# Altium footprint library SPECIAL.PcbLib: 68 footprints (part 3 of 5)
Each footprint in its own frame and in the unit in brackets; x right, y up, seen from the top. Pads: shape width x height; smd on the part's side, far side on the other; paste and mask are expansions set on the pad; w line width, h text height; cw(c..) or ccw(c..) is an arc to the next point about the centre after c.
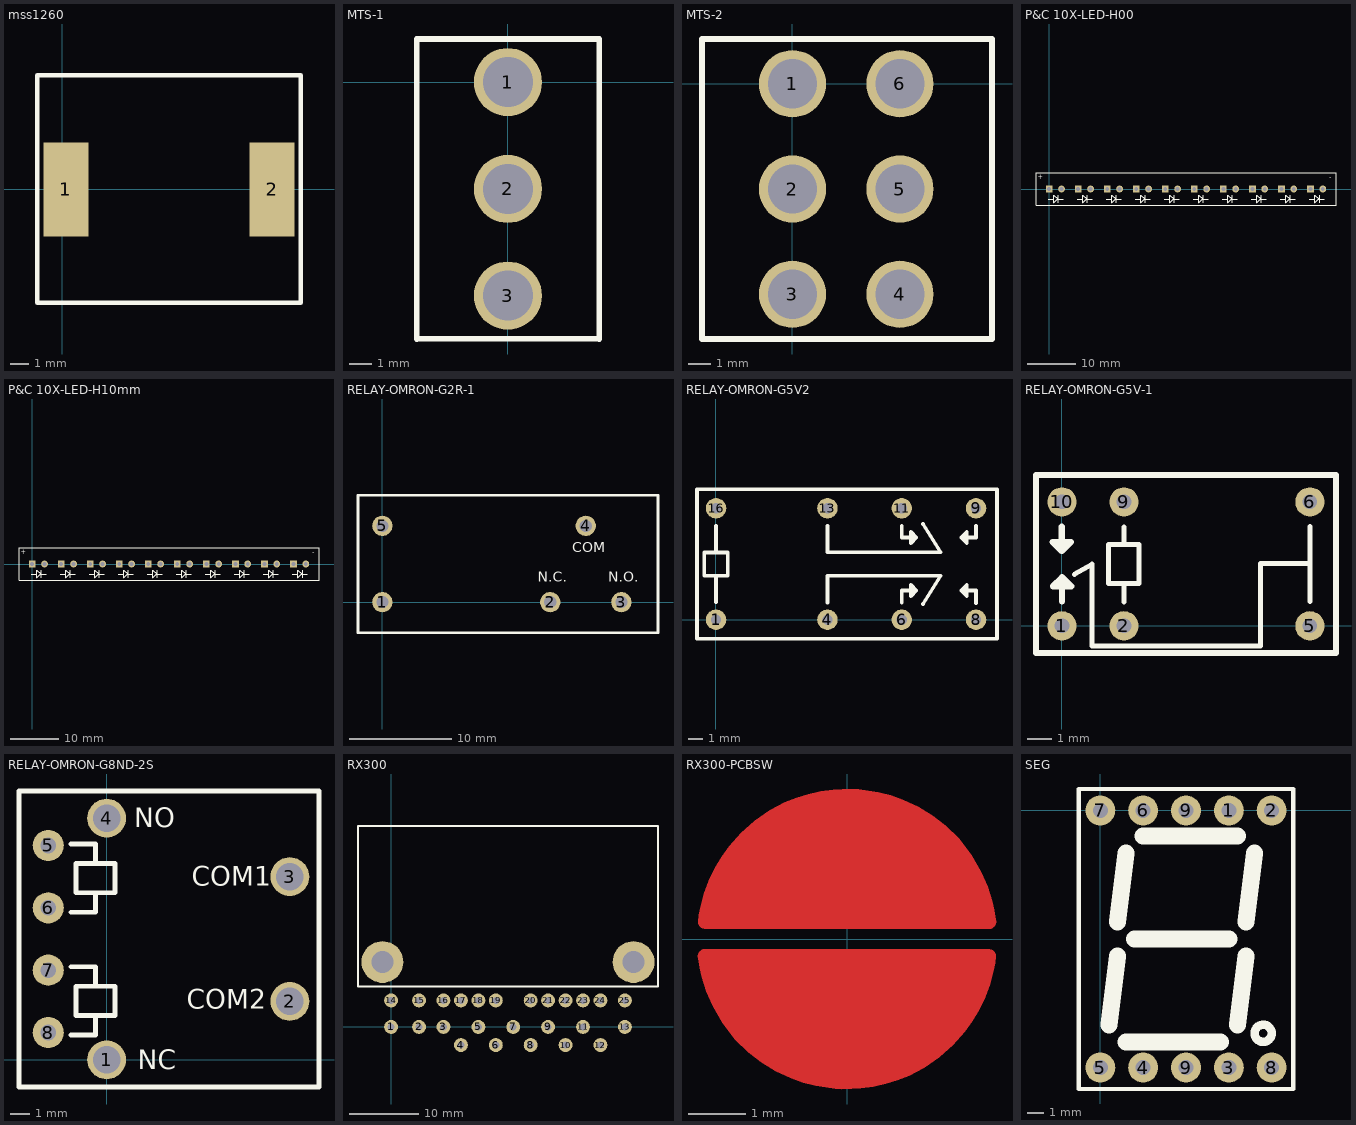
[diagram p2: the footprints below, top view; thin cyan lines are the x and y axes]

## mss1260 [mm]
pads (2):
  rect 2.4x5 smd: 1(0.2,-0.008) 2(11.2,-0.008)
Top Overlay:
  lines w0.25: -1.335,-6.044 -1.335,6.08 ; -1.334,-6.044 12.725,-6.044 ; -1.334,6.08 12.726,6.08 ; 12.73,-6.044 12.73,6.08
3D body "SW3dPS-MSS1260.STEP": height 6.2, standoff 0.06, extent -0.496,-6.12 11.803,6.18

## MTS-1 [mm]
pads (3):
  round 3 hole 2.2: 1(0,0) 2(0,-4.7) 3(0,-9.4)
Top Overlay:
  lines w0.254: -4.01,-11.31 -4.01,1.9 ; -4,-11.3 4,-11.3 ; -4,1.9 4,1.9 ; 4.02,-11.31 4.02,1.9
3D body "User Library-MTS-10x-A2.STEP": height 28.34, standoff -6.3, extent -3.86,-11.39 4.04,1.81

## MTS-2 [mm]
pads (6):
  round 3 hole 2.2: 1(0,0) 2(0,-4.7) 3(0,-9.4) 4(4.8,-9.4) 5(4.8,-4.7) 6(4.8,0)
Top Overlay:
  lines w0.254: -4.04,-11.4 8.91,-11.4 8.91,2 -4.04,2 -4.04,-11.4
3D body "User Library-MTS-20x-A2.STEP": height 28.84, standoff -5.8, extent -3.93,-11.31 8.77,1.89

## P&C 10X-LED-H00 [mm]
height 18
pads (20):
  rect 1.4x1.4 hole 0.8: 1(0,0) 1(5.95,0) 1(11.9,0) 1(17.85,0) 1(23.8,0) 1(29.75,0) 1(35.7,0) 1(41.65,0) 1(47.6,0) 1(53.55,0)
  round 1.4 hole 0.8: 2(2.54,0) 2(8.49,0) 2(14.44,0) 2(20.39,0) 2(26.34,0) 2(32.29,0) 2(38.24,0) 2(44.19,0) 2(50.14,0) 2(56.09,0)
Top Overlay:
  lines w0.2: -0.19,-2.06 0.93,-2.06 ; 1.72,-2.05 2.84,-2.05 ; 1.87,-2.82 1.87,-1.26 ; 5.76,-2.06 6.88,-2.06 ; 7.67,-2.05 8.79,-2.05 ; 7.82,-2.82 7.82,-1.26 ; 11.71,-2.06 12.83,-2.06 ; 13.62,-2.05 14.74,-2.05 ; 13.77,-2.82 13.77,-1.26 ; 17.66,-2.06 18.78,-2.06 ; 19.57,-2.05 20.69,-2.05 ; 19.72,-2.82 19.72,-1.26 ; 23.61,-2.06 24.73,-2.06 ; 25.52,-2.05 26.64,-2.05 ; 25.67,-2.82 25.67,-1.26 ; 29.56,-2.06 30.68,-2.06 ; 31.47,-2.05 32.59,-2.05 ; 31.62,-2.82 31.62,-1.26 ; 35.51,-2.06 36.63,-2.06 ; 37.42,-2.05 38.54,-2.05 ; 37.57,-2.82 37.57,-1.26 ; 41.46,-2.06 42.58,-2.06 ; 43.37,-2.05 44.49,-2.05 ; 43.52,-2.82 43.52,-1.26 ; 47.41,-2.06 48.53,-2.06 ; 49.32,-2.05 50.44,-2.05 ; 49.47,-2.82 49.47,-1.26 ; 53.36,-2.06 54.48,-2.06 ; 55.27,-2.05 56.39,-2.05 ; 55.42,-2.82 55.42,-1.26 ; 1.72,-2.04 0.94,-1.26 0.94,-2.82 1.72,-2.04 ; 1.72,-2.04 1.72,-2.04 ; 7.67,-2.04 6.89,-2.82 6.89,-1.26 7.67,-2.04 ; 7.67,-2.04 7.67,-2.04 ; 13.62,-2.04 12.84,-2.82 12.84,-1.26 13.62,-2.04 ; 13.62,-2.04 13.62,-2.04 ; 19.57,-2.04 18.79,-2.82 18.79,-1.26 19.57,-2.04 ; 19.57,-2.04 19.57,-2.04 ; 25.52,-2.04 24.74,-2.82 24.74,-1.26 25.52,-2.04 ; 25.52,-2.04 25.52,-2.04 ; 31.47,-2.04 30.69,-2.82 30.69,-1.26 31.47,-2.04 ; 31.47,-2.04 31.47,-2.04 ; 37.42,-2.04 36.64,-2.82 36.64,-1.26 37.42,-2.04 ; 37.42,-2.04 37.42,-2.04 ; 43.37,-2.04 42.59,-2.82 42.59,-1.26 43.37,-2.04 ; 43.37,-2.04 43.37,-2.04 ; 49.32,-2.04 48.54,-2.82 48.54,-1.26 49.32,-2.04 ; 49.32,-2.04 49.32,-2.04 ; 55.27,-2.04 54.49,-2.82 54.49,-1.26 55.27,-2.04 ; 55.27,-2.04 55.27,-2.04 ; -2.7,-3.3 58.8,-3.3 58.8,3.3 -2.7,3.3 -2.7,-3.3
  text "+" at -2.32,2 h1
  text "-" at 57.4,2 h1
3D body: height 8.5, standoff 7, extent 51.3,-1.45 57.25,1.45
3D body: height 7, standoff 0, extent 51.3,-3 58.35,3
3D body: height 8.5, standoff 7, extent 52.4,-1.45 58.35,1.45
3D body: height 7, standoff 0, extent 45.35,-3 51.3,3
3D body: height 8.5, standoff 7, extent 45.35,-1.45 51.3,1.45
3D body: height 7, standoff 0, extent 39.4,-3 45.35,3
3D body: height 8.5, standoff 7, extent 39.4,-1.45 45.35,1.45
3D body: height 7, standoff 0, extent 33.45,-3 39.4,3
3D body: height 8.5, standoff 7, extent 33.45,-1.45 39.4,1.45
3D body: height 7, standoff 0, extent 27.5,-3 33.45,3
3D body: height 8.5, standoff 7, extent 27.5,-1.45 33.45,1.45
3D body: height 7, standoff 0, extent 21.55,-3 27.5,3
3D body: height 8.5, standoff 7, extent 21.55,-1.45 27.5,1.45
3D body: height 7, standoff 0, extent 15.6,-3 21.55,3
3D body: height 8.5, standoff 7, extent 15.6,-1.45 21.55,1.45
3D body: height 7, standoff 0, extent 9.65,-3 15.6,3
3D body: height 8.5, standoff 7, extent 9.65,-1.45 15.6,1.45
3D body: height 7, standoff 0, extent 3.7,-3 9.65,3
3D body: height 8.5, standoff 7, extent 3.7,-1.45 9.65,1.45
3D body: height 8.5, standoff 7, extent -2.25,-1.45 3.7,1.45
3D body: height 7, standoff 0, extent -2.25,-3 3.7,3
3D body: height 3.8, standoff 0.3, extent 4.8,-1.45 9.65,1.45
3D body: height 8.4, standoff 3.8, extent 4.8,-0.55 9.65,0.55
3D body: height 15, standoff -3, extent 8.24,-0.25 8.74,0.25
3D body: height 17, standoff -3, extent 5.7,-0.25 6.2,0.25
3D body: height 17, standoff -3, extent -0.25,-0.25 0.25,0.25
3D body: height 15, standoff -3, extent 2.29,-0.25 2.79,0.25
3D body: height 8.4, standoff 3.8, extent -1.15,-0.55 3.7,0.55
3D body: height 3.8, standoff 0.3, extent -1.15,-1.45 3.7,1.45
3D body: height 15, standoff -3, extent 14.19,-0.25 14.69,0.25
3D body: height 3.8, standoff 0.3, extent 10.75,-1.45 15.6,1.45
3D body: height 8.4, standoff 3.8, extent 10.75,-0.55 15.6,0.55
3D body: height 17, standoff -3, extent 11.65,-0.25 12.15,0.25
3D body: height 3.8, standoff 0.3, extent 16.7,-1.45 21.55,1.45
3D body: height 8.4, standoff 3.8, extent 16.7,-0.55 21.55,0.55
3D body: height 15, standoff -3, extent 20.14,-0.25 20.64,0.25
3D body: height 17, standoff -3, extent 17.6,-0.25 18.1,0.25
3D body: height 3.8, standoff 0.3, extent 22.65,-1.45 27.5,1.45
3D body: height 8.4, standoff 3.8, extent 22.65,-0.55 27.5,0.55
3D body: height 15, standoff -3, extent 26.09,-0.25 26.59,0.25
3D body: height 17, standoff -3, extent 23.55,-0.25 24.05,0.25
3D body: height 3.8, standoff 0.3, extent 28.6,-1.45 33.45,1.45
3D body: height 8.4, standoff 3.8, extent 28.6,-0.55 33.45,0.55
3D body: height 15, standoff -3, extent 32.04,-0.25 32.54,0.25
3D body: height 17, standoff -3, extent 29.5,-0.25 30,0.25
3D body: height 3.8, standoff 0.3, extent 34.55,-1.45 39.4,1.45
3D body: height 8.4, standoff 3.8, extent 34.55,-0.55 39.4,0.55
3D body: height 15, standoff -3, extent 37.99,-0.25 38.49,0.25
3D body: height 17, standoff -3, extent 35.45,-0.25 35.95,0.25
3D body: height 3.8, standoff 0.3, extent 40.5,-1.45 45.35,1.45
3D body: height 8.4, standoff 3.8, extent 40.5,-0.55 45.35,0.55
3D body: height 15, standoff -3, extent 43.94,-0.25 44.44,0.25
3D body: height 17, standoff -3, extent 41.4,-0.25 41.9,0.25
3D body: height 3.8, standoff 0.3, extent 46.45,-1.45 51.3,1.45
3D body: height 8.4, standoff 3.8, extent 46.45,-0.55 51.3,0.55
3D body: height 15, standoff -3, extent 49.89,-0.25 50.39,0.25
3D body: height 17, standoff -3, extent 47.35,-0.25 47.85,0.25
3D body: height 3.8, standoff 0.3, extent 52.4,-1.45 57.25,1.45
3D body: height 8.4, standoff 3.8, extent 52.4,-0.55 57.25,0.55
3D body: height 15, standoff -3, extent 55.84,-0.25 56.34,0.25
3D body: height 17, standoff -3, extent 53.3,-0.25 53.8,0.25

## P&C 10X-LED-H10mm [mm]
height 18
pads (20):
  rect 1.4x1.4 hole 0.8: 1(0,0) 1(5.95,0) 1(11.9,0) 1(17.85,0) 1(23.8,0) 1(29.75,0) 1(35.7,0) 1(41.65,0) 1(47.6,0) 1(53.55,0)
  round 1.4 hole 0.8: 2(2.54,0) 2(8.49,0) 2(14.44,0) 2(20.39,0) 2(26.34,0) 2(32.29,0) 2(38.24,0) 2(44.19,0) 2(50.14,0) 2(56.09,0)
Top Overlay:
  lines w0.2: -0.19,-2.06 0.93,-2.06 ; 1.72,-2.05 2.84,-2.05 ; 1.87,-2.82 1.87,-1.26 ; 5.76,-2.06 6.88,-2.06 ; 7.67,-2.05 8.79,-2.05 ; 7.82,-2.82 7.82,-1.26 ; 11.71,-2.06 12.83,-2.06 ; 13.62,-2.05 14.74,-2.05 ; 13.77,-2.82 13.77,-1.26 ; 17.66,-2.06 18.78,-2.06 ; 19.57,-2.05 20.69,-2.05 ; 19.72,-2.82 19.72,-1.26 ; 23.61,-2.06 24.73,-2.06 ; 25.52,-2.05 26.64,-2.05 ; 25.67,-2.82 25.67,-1.26 ; 29.56,-2.06 30.68,-2.06 ; 31.47,-2.05 32.59,-2.05 ; 31.62,-2.82 31.62,-1.26 ; 35.51,-2.06 36.63,-2.06 ; 37.42,-2.05 38.54,-2.05 ; 37.57,-2.82 37.57,-1.26 ; 41.46,-2.06 42.58,-2.06 ; 43.37,-2.05 44.49,-2.05 ; 43.52,-2.82 43.52,-1.26 ; 47.41,-2.06 48.53,-2.06 ; 49.32,-2.05 50.44,-2.05 ; 49.47,-2.82 49.47,-1.26 ; 53.36,-2.06 54.48,-2.06 ; 55.27,-2.05 56.39,-2.05 ; 55.42,-2.82 55.42,-1.26 ; 1.72,-2.04 0.94,-2.82 0.94,-1.26 1.72,-2.04 ; 1.72,-2.04 1.72,-2.04 ; 7.67,-2.04 6.89,-1.26 6.89,-2.82 7.67,-2.04 ; 7.67,-2.04 7.67,-2.04 ; 13.62,-2.04 12.84,-1.26 12.84,-2.82 13.62,-2.04 ; 13.62,-2.04 13.62,-2.04 ; 19.57,-2.04 18.79,-1.26 18.79,-2.82 19.57,-2.04 ; 19.57,-2.04 19.57,-2.04 ; 25.52,-2.04 24.74,-1.26 24.74,-2.82 25.52,-2.04 ; 25.52,-2.04 25.52,-2.04 ; 31.47,-2.04 30.69,-1.26 30.69,-2.82 31.47,-2.04 ; 31.47,-2.04 31.47,-2.04 ; 37.42,-2.04 36.64,-1.26 36.64,-2.82 37.42,-2.04 ; 37.42,-2.04 37.42,-2.04 ; 43.37,-2.04 42.59,-1.26 42.59,-2.82 43.37,-2.04 ; 43.37,-2.04 43.37,-2.04 ; 49.32,-2.04 48.54,-1.26 48.54,-2.82 49.32,-2.04 ; 49.32,-2.04 49.32,-2.04 ; 55.27,-2.04 54.49,-1.26 54.49,-2.82 55.27,-2.04 ; 55.27,-2.04 55.27,-2.04 ; -2.7,-3.3 -2.7,3.3 58.8,3.3 58.8,-3.3 -2.7,-3.3
  text "-" at 57.4,2 h1
  text "+" at -2.32,2 h1
3D body: height 4, standoff -13, extent 53.3,-0.25 53.8,0.25
3D body: height 2, standoff -13, extent 55.84,-0.25 56.34,0.25
3D body: height 18.4, standoff 13.8, extent 52.4,-0.55 57.25,0.55
3D body: height 13.8, standoff 10.3, extent 52.4,-1.45 57.25,1.45
3D body: height 4, standoff -13, extent 47.35,-0.25 47.85,0.25
3D body: height 2, standoff -13, extent 49.89,-0.25 50.39,0.25
3D body: height 18.4, standoff 13.8, extent 46.45,-0.55 51.3,0.55
3D body: height 13.8, standoff 10.3, extent 46.45,-1.45 51.3,1.45
3D body: height 4, standoff -13, extent 41.4,-0.25 41.9,0.25
3D body: height 2, standoff -13, extent 43.94,-0.25 44.44,0.25
3D body: height 18.4, standoff 13.8, extent 40.5,-0.55 45.35,0.55
3D body: height 13.8, standoff 10.3, extent 40.5,-1.45 45.35,1.45
3D body: height 4, standoff -13, extent 35.45,-0.25 35.95,0.25
3D body: height 2, standoff -13, extent 37.99,-0.25 38.49,0.25
3D body: height 18.4, standoff 13.8, extent 34.55,-0.55 39.4,0.55
3D body: height 13.8, standoff 10.3, extent 34.55,-1.45 39.4,1.45
3D body: height 4, standoff -13, extent 29.5,-0.25 30,0.25
3D body: height 2, standoff -13, extent 32.04,-0.25 32.54,0.25
3D body: height 18.4, standoff 13.8, extent 28.6,-0.55 33.45,0.55
3D body: height 13.8, standoff 10.3, extent 28.6,-1.45 33.45,1.45
3D body: height 4, standoff -13, extent 23.55,-0.25 24.05,0.25
3D body: height 2, standoff -13, extent 26.09,-0.25 26.59,0.25
3D body: height 18.4, standoff 13.8, extent 22.65,-0.55 27.5,0.55
3D body: height 13.8, standoff 10.3, extent 22.65,-1.45 27.5,1.45
3D body: height 4, standoff -13, extent 17.6,-0.25 18.1,0.25
3D body: height 2, standoff -13, extent 20.14,-0.25 20.64,0.25
3D body: height 18.4, standoff 13.8, extent 16.7,-0.55 21.55,0.55
3D body: height 13.8, standoff 10.3, extent 16.7,-1.45 21.55,1.45
3D body: height 4, standoff -13, extent 11.65,-0.25 12.15,0.25
3D body: height 18.4, standoff 13.8, extent 10.75,-0.55 15.6,0.55
3D body: height 13.8, standoff 10.3, extent 10.75,-1.45 15.6,1.45
3D body: height 2, standoff -13, extent 14.19,-0.25 14.69,0.25
3D body: height 13.8, standoff 10.3, extent -1.15,-1.45 3.7,1.45
3D body: height 18.4, standoff 13.8, extent -1.15,-0.55 3.7,0.55
3D body: height 2, standoff -13, extent 2.29,-0.25 2.79,0.25
3D body: height 4, standoff -13, extent -0.25,-0.25 0.25,0.25
3D body: height 4, standoff -13, extent 5.7,-0.25 6.2,0.25
3D body: height 2, standoff -13, extent 8.24,-0.25 8.74,0.25
3D body: height 18.4, standoff 13.8, extent 4.8,-0.55 9.65,0.55
3D body: height 13.8, standoff 10.3, extent 4.8,-1.45 9.65,1.45
3D body: height 17, standoff 10, extent -2.25,-3 3.7,3
3D body: height 18.5, standoff 17, extent -2.25,-1.45 3.7,1.45
3D body: height 18.5, standoff 17, extent 3.7,-1.45 9.65,1.45
3D body: height 17, standoff 10, extent 3.7,-3 9.65,3
3D body: height 18.5, standoff 17, extent 9.65,-1.45 15.6,1.45
3D body: height 17, standoff 10, extent 9.65,-3 15.6,3
3D body: height 18.5, standoff 17, extent 15.6,-1.45 21.55,1.45
3D body: height 17, standoff 10, extent 15.6,-3 21.55,3
3D body: height 18.5, standoff 17, extent 21.55,-1.45 27.5,1.45
3D body: height 17, standoff 10, extent 21.55,-3 27.5,3
3D body: height 18.5, standoff 17, extent 27.5,-1.45 33.45,1.45
3D body: height 17, standoff 10, extent 27.5,-3 33.45,3
3D body: height 18.5, standoff 17, extent 33.45,-1.45 39.4,1.45
3D body: height 17, standoff 10, extent 33.45,-3 39.4,3
3D body: height 18.5, standoff 17, extent 39.4,-1.45 45.35,1.45
3D body: height 17, standoff 10, extent 39.4,-3 45.35,3
3D body: height 18.5, standoff 17, extent 45.35,-1.45 51.3,1.45
3D body: height 17, standoff 10, extent 45.35,-3 51.3,3
3D body: height 18.5, standoff 17, extent 52.4,-1.45 58.35,1.45
3D body: height 17, standoff 10, extent 51.3,-3 58.35,3
3D body: height 18.5, standoff 17, extent 51.3,-1.45 57.25,1.45

## RELAY-OMRON-G2R-1 [mm]
pads (5):
  round 2 hole 1.2: 1(-0.004,-0.004) 2(16.496,-0.004) 3(23.496,-0.004) 4(19.996,7.496) 5(-0.004,7.496)
Top Overlay:
  lines w0.25: -2.404,-3.004 -2.404,10.496 27.096,10.496 27.096,-3.004 -2.404,-3.004
  text "COM" at 18.671,4.921 h1
  text "N.O." at 22.221,1.996 h1
  text "N.C." at 15.271,1.996 h1
3D body "RELAY_G2R-1.STEP": height 25.5, standoff -4, extent -2.174,-2.854 26.826,10.146

## RELAY-OMRON-G5V2 [mm]
pads (8):
  round 1.4 hole 0.7: 1(0.005,0.015) 4(7.625,0.015) 6(12.705,0.015) 8(17.785,0.015) 9(17.785,7.635) 11(12.705,7.635) 13(7.625,7.635) 16(0.005,7.635)
Top Overlay:
  lines w0.25: 0.005,1.198 0.005,3.015 ; 0.005,4.635 0.005,6.42 ; 7.625,1.176 7.625,3.015 15.351,3.015 14.156,1.095 ; 7.625,6.446 7.625,4.635 15.351,4.635 14.156,6.555 ; 12.705,1.166 12.705,2.015 13.705,2.015 ; 12.705,6.436 12.705,5.635 13.705,5.635 ; 17.783,1.144 17.783,2.015 16.786,2.015 ; 17.785,6.45 17.785,5.635 16.786,5.635 ; 13.705,2.015 13.33,2.39 13.33,1.64 13.705,2.015 ; 13.705,5.635 13.33,5.26 13.33,6.01 13.705,5.635 ; 16.786,2.015 17.161,2.39 17.161,1.64 16.786,2.015 ; 16.786,5.635 17.161,5.26 17.161,6.01 16.786,5.635 ; -1.294,-1.285 -1.294,8.935 19.218,8.935 19.218,-1.285 -1.294,-1.285 ; -0.794,3.015 0.805,3.015 0.805,4.615 -0.794,4.615 -0.794,3.015
3D body "User Library-OMRON G5V-2 - Relay Chico.STEP": height 12.51, standoff -3, extent -1.324,-1.169 19.176,8.831

## RELAY-OMRON-G5V-1 [mm]
height 11
pads (6):
  round 1.2 hole 0.6: 1(0,0) 2(2.54,0) 5(10.16,0) 6(10.16,5.08) 9(2.54,5.08) 10(0,5.08)
Top Overlay:
  lines w0.2: 0.509,2.112 1.235,2.53 1.235,-0.831 8.135,-0.831 8.135,2.555 10.16,2.555 ; 2.535,0.98 2.535,1.705 ; 2.535,3.33 2.535,4.055 ; 10.16,1.005 10.16,4.08 ; 1.91,1.73 3.16,1.73 3.16,3.33 1.91,3.33 1.91,1.73
  lines w0.25: -0.01,4.06 -0.01,3.06 ; 0.005,1 0.005,2 ; 11.21,-1.11 -1.065,-1.11 -1.065,6.18 11.23,6.18 11.23,-1.11 ; -0.01,3.06 -0.385,3.435 0.365,3.435 -0.01,3.06 ; 0.005,2 0.38,1.625 -0.37,1.625 0.005,2
3D body "SW3dPS-G5V-1.STEP": height 10, standoff -3, extent -1.16,-1.22 11.34,6.28

## RELAY-OMRON-G8ND-2S [mm]
pads (8):
  round 2 hole 1.4: 1(0,0) 2(9.4,3) 3(9.4,9.4) 4(0,12.4)
  round 1.6 hole 0.8: 5(-3,11) 6(-3,7.8) 7(-3,4.6) 8(-3,1.4)
Top Overlay:
  lines w0.25: -1.825,1.275 -0.575,1.275 -0.575,2.275 ; -1.825,4.775 -0.575,4.775 -0.575,3.775 ; -1.825,7.575 -0.575,7.575 -0.575,8.575 ; -1.825,11.075 -0.575,11.075 -0.575,10.075 ; -4.5,-1.4 -4.5,13.8 10.9,13.8 10.9,-1.4 -4.5,-1.4 ; -1.575,2.275 0.425,2.275 0.425,3.775 -1.575,3.775 -1.575,2.275 ; -1.575,8.575 0.425,8.575 0.425,10.075 -1.575,10.075 -1.575,8.575
  text "COM2" at 4.1,2.625 h1
  text "COM1" at 4.375,8.925 h1
  text "NO" at 1.425,11.925 h1
  text "NC" at 1.6,-0.475 h1
3D body "User Library-G8ND-2S.STEP": height 13.1, standoff -3.9, extent -3.79,-0.58 10.21,13.02

## RX300 [mm]
pads (27):
  round 2 hole 1: 1(0,0) 2(4,0) 3(7.5,0.01) 4(10,-2.6) 5(12.5,0) 6(15,-2.6) 7(17.5,0) 8(20,-2.6) 9(22.5,0) 10(25,-2.6) 11(27.5,0) 12(30,-2.6) 13(33.5,0) 14(0,3.8) 15(4,3.8) 16(7.5,3.8) 17(10,3.8) 18(12.5,3.8) 19(15,3.8) 20(20,3.8) 21(22.5,3.8) 22(25,3.8) 23(27.5,3.8) 24(30,3.8) 25(33.5,3.8)
  round 6 hole 3.2: ""(-1.25,9.3) ""(34.75,9.3)
Top Overlay:
  lines w0.254: -4.75,5.8 -4.75,28.8 38.25,28.8 38.25,5.8 -4.75,5.8

## RX300-PCBSW [mm]
Top Layer:
  region: -0.002,0.178 2.483,0.178 2.501,0.179 2.522,0.184 2.542,0.193 2.561,0.205 2.573,0.217 2.583,0.229 2.588,0.236 2.593,0.245 2.602,0.263 2.608,0.295 2.608,0.316 2.605,0.337 2.579,0.5 2.543,0.663 2.46,0.919 2.352,1.172 2.176,1.472 1.954,1.762 1.731,1.981 1.5,2.16 1.245,2.313 0.978,2.442 0.764,2.518 0.544,2.571 0.43,2.591 0.314,2.608 0.208,2.619 0.086,2.627 -0.083,2.625 -0.247,2.616 -0.462,2.586 -0.678,2.539 -0.886,2.471 -1.093,2.393 -1.355,2.251 -1.621,2.072 -1.85,1.862 -2.066,1.628 -2.193,1.443 -2.318,1.24 -2.421,1.018 -2.509,0.783 -2.57,0.542 -2.593,0.421 -2.609,0.302 -2.605,0.275 -2.597,0.252 -2.586,0.233 -2.573,0.216 -2.555,0.2 -2.532,0.188 -2.504,0.179 -2.476,0.177
  region: -0.002,-0.176 -2.487,-0.176 -2.505,-0.177 -2.526,-0.182 -2.546,-0.191 -2.565,-0.203 -2.577,-0.215 -2.587,-0.227 -2.592,-0.234 -2.597,-0.243 -2.606,-0.261 -2.612,-0.293 -2.612,-0.314 -2.609,-0.335 -2.583,-0.498 -2.547,-0.661 -2.464,-0.917 -2.356,-1.17 -2.18,-1.47 -1.958,-1.76 -1.735,-1.979 -1.504,-2.158 -1.249,-2.311 -0.982,-2.44 -0.768,-2.516 -0.548,-2.569 -0.434,-2.589 -0.318,-2.606 -0.212,-2.617 -0.09,-2.625 0.079,-2.623 0.243,-2.614 0.458,-2.584 0.674,-2.537 0.882,-2.469 1.089,-2.391 1.351,-2.249 1.617,-2.07 1.846,-1.86 2.062,-1.626 2.189,-1.441 2.314,-1.238 2.417,-1.016 2.505,-0.781 2.566,-0.54 2.589,-0.419 2.605,-0.3 2.601,-0.273 2.593,-0.25 2.582,-0.231 2.569,-0.214 2.551,-0.198 2.528,-0.186 2.5,-0.177 2.472,-0.175
Top Solder:
  circle w3: c0,0 r1.3

## SEG [mil]
pads (10):
  round 70 hole 35: 1(299.99,0.05) 2(399.99,0.05) 3(299.99,-599.95) 4(99.99,-599.95) 5(-0.01,-599.95) 6(99.99,0.05) 7(-0.01,0.05) 8(399.99,-599.95) 9(199.99,-599.95) 9(199.99,0.05)
Top Overlay:
  circle w20: c379.99,-519.95 r20
  lines w10: -50.01,-649.95 449.99,-649.95 449.99,50.05 -50.01,50.05 -50.01,-649.95
  lines w40: 19.99,-499.95 39.99,-339.95 ; 39.99,-259.95 59.99,-99.95 ; 59.99,-539.95 279.99,-539.95 ; 79.99,-299.95 299.99,-299.95 ; 99.99,-59.95 319.99,-59.95 ; 319.99,-499.95 339.99,-339.95 ; 339.99,-259.95 359.99,-99.95